# Altium footprint library Library.PcbLib: 292 footprints (part 5 of 20)
Each footprint in its own frame and in the unit in brackets; x right, y up, seen from the top. Pads: shape width x height; smd on the part's side, far side on the other; paste and mask are expansions set on the pad; w line width, h text height; cw(c..) or ccw(c..) is an arc to the next point about the centre after c.
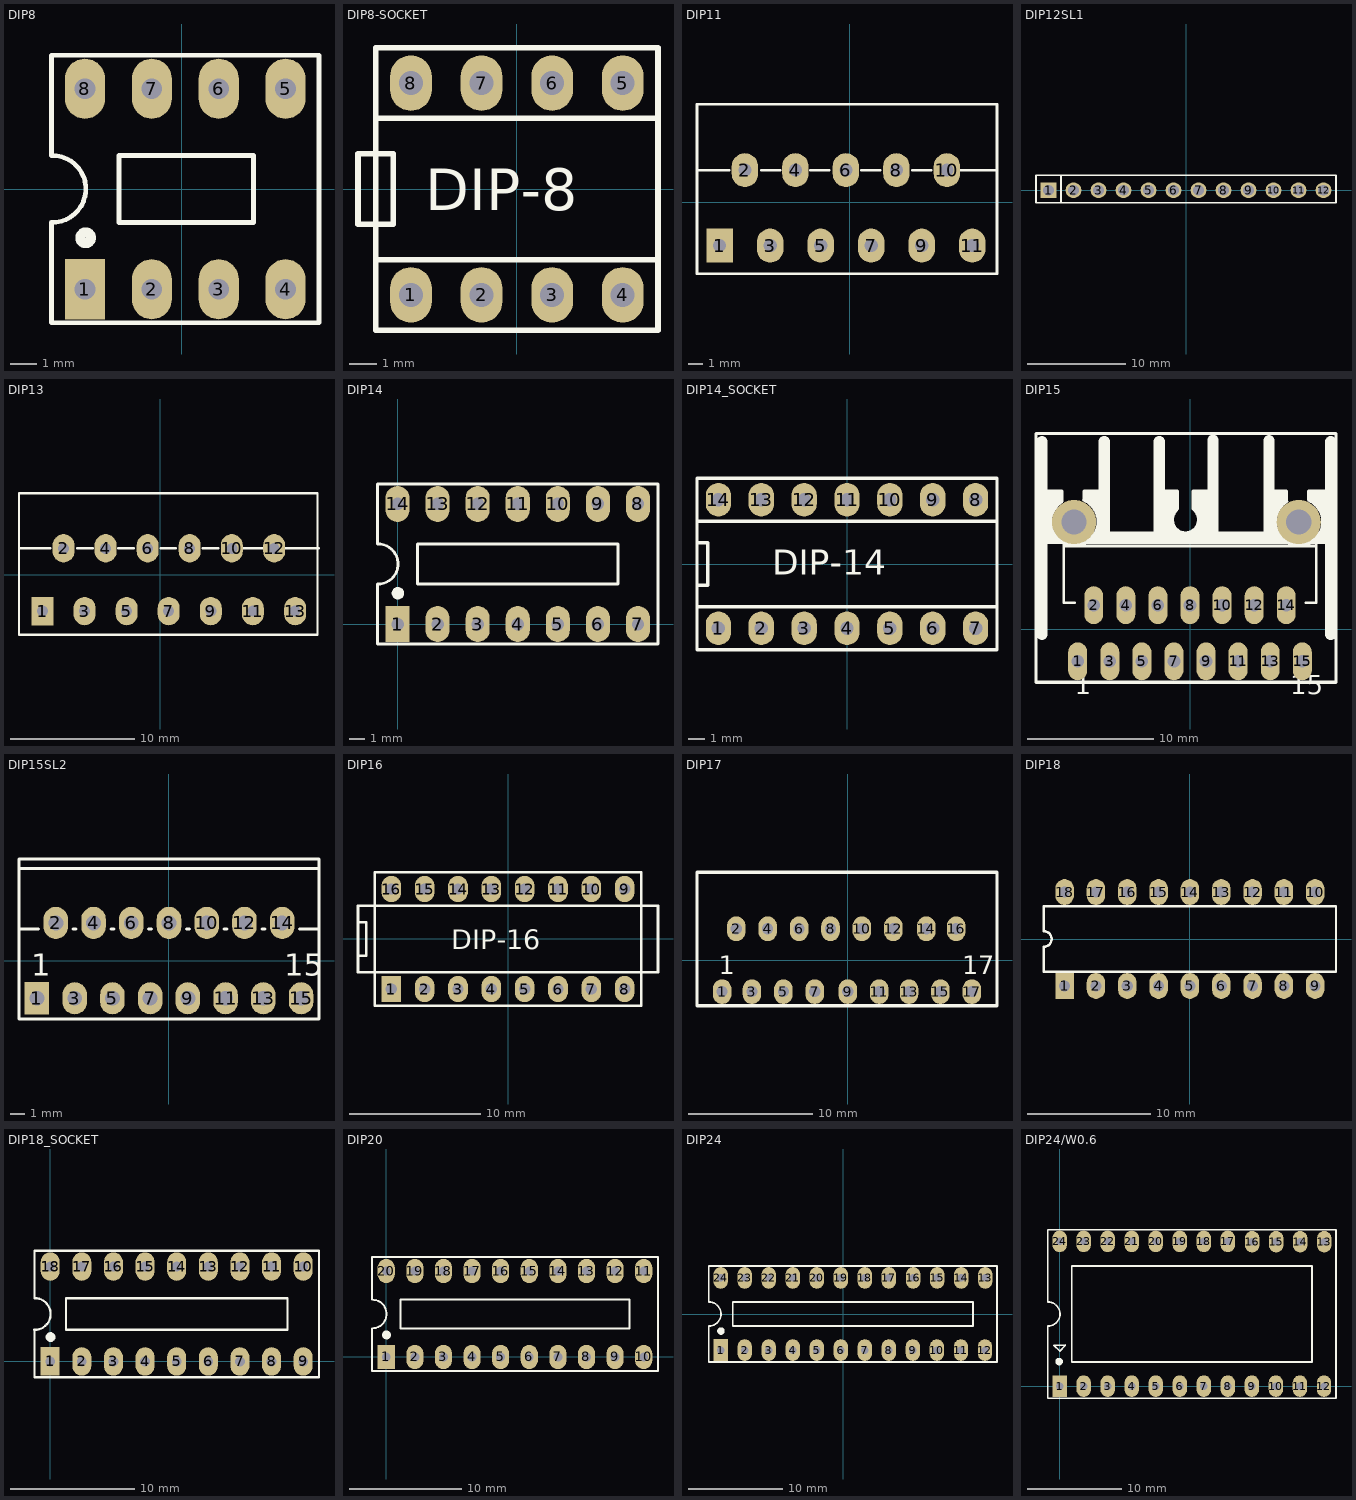
[diagram p4: the footprints below, top view; thin cyan lines are the x and y axes]

## DIP8 [mil] "DIP, 8-Leads, Row Spacing 7.62mm, Pitch 2.54mm, Body 9.91x6.73mm"
height 200
pads (8):
  rect 60x90 hole 31: 1(-145,-150)
  oval 60x90 hole 31: 2(-45,-150) 3(55,-150) 4(155,-150) 5(155,150) 6(55,150) 7(-45,150) 8(-145,150)
Top Overlay:
  circle w15: c-144,-73 r8
  lines w7: -195.38,-49.95 ccw(c-193.69,0.02) -195,50 ; -195,-50 -195,-200 205,-200 205,200 -195,200 -195,51 ; -94,-50 -94,50 107,50 107,-50 -94,-50
3D body "User Library-DIP8-300-metric.step": height 177.17, standoff -137.8, extent -212.6,-152.76 212.6,152.77

## DIP8-SOCKET [mm] "DIP, 8-Leads, Row Spacing 7.62mm, Pitch 2.54mm, Body 9.91x6.73mm"
pads (8):
  oval 1.5x2 hole 0.864: 1(-3.81,-3.81) 2(-1.27,-3.81) 3(1.27,-3.81) 4(3.81,-3.81) 5(3.81,3.81) 6(1.27,3.81) 7(-1.27,3.81) 8(-3.81,3.81)
Top Overlay:
  lines w0.203: -5.08,-2.54 5.08,-2.54 ; -5.08,-2.54 -5.08,2.54 ; -5.08,-2.54 5.08,-2.54 ; -5.08,-2.54 -5.08,2.54 ; -5.08,-2.54 -5.08,-5.08 5.08,-5.08 5.08,2.54 ; -5.08,-2.54 -5.08,-1.27 -4.445,-1.27 ; -5.08,2.54 5.08,2.54 ; -5.08,2.54 5.08,2.54 ; -4.445,-1.27 -4.445,1.27 ; -4.445,-1.27 -5.715,-1.27 -5.715,1.27 -4.445,1.27 ; -4.445,-1.27 -4.445,1.27 ; -4.445,1.27 -5.08,1.27 -5.08,5.08 5.08,5.08 5.08,2.54 ; 5.08,-2.54 5.08,2.54 ; 5.08,-2.54 5.08,2.54
  text "DIP-8" at -3.302,-0.762 h1.5
3D body "User Library-DIP8-300-metric.step": height 8.5, standoff 0.5, extent -5.654,-4.007 5.146,3.753
3D body "Socket 8.step": height 4.5, standoff -3.09, extent -5.08,-5.08 5.08,5.08

## DIP11 [mil]
pads (11):
  rect 70x90 hole 35: 1(-345,-115)
  oval 70x90 hole 35: 2(-278.07,85) 3(-211.14,-115) 4(-144.21,85) 5(-77.28,-115) 6(-10.35,85) 7(56.57,-115) 8(123.5,85) 9(190.43,-115) 10(257.36,85) 11(324.29,-115)
Top Overlay:
  lines w7: -405,85 -320,85 ; -235,85 -185,85 ; -105,85 -55,85 ; 30,85 80,85 ; 165,85 215,85 ; 285,85 390,85 ; -405,-190 -405,260 390,260 390,-190 -405,-190
3D body "User Library-TDA 2004R.step": height 826.77, standoff -138.19, extent -404.09,-120 384.09,252.82

## DIP12SL1 [mm]
height 8.54
pads (12):
  rect 1.6x1.6 hole 1.1: 1(-13.97,0)
  round 1.6 hole 1.1: 2(-11.43,0) 3(-8.89,0) 4(-6.35,0) 5(-3.81,0) 6(-1.27,0) 7(1.27,0) 8(3.81,0) 9(6.35,0) 10(8.89,0) 11(11.43,0) 12(13.97,0)
Top Overlay:
  lines w0.2: -12.7,-1.27 -12.7,1.397 ; -15.24,-1.27 15.24,-1.27 15.24,1.524 -13.081,1.524 -15.24,1.524 -15.24,-1.27
3D body: height 18, standoff 8, extent -14.986,1.27 14.859,1.651
3D body: height 12, standoff 4.5, extent -15.367,-1.397 15.24,1.524
3D body "61301211121.stp": height 10.17, standoff -1.37, extent -15.24,-1.27 15.24,1.27

## DIP13 [mil]
pads (13):
  rect 70x90 hole 35: 1(-375,-115)
  oval 70x90 hole 35: 2(-308.07,85) 3(-241.14,-115) 4(-174.21,85) 5(-107.28,-115) 6(-40.35,85) 7(26.57,-115) 8(93.5,85) 9(160.43,-115) 10(227.36,85) 11(294.29,-115) 12(362.36,85) 13(429.29,-115)
Top Overlay:
  lines w7: -450,85 -350,85 ; -265,85 -215,85 ; -135,85 -85,85 ; 0,85 50,85 ; 135,85 185,85 ; 255,85 505,85 ; -450,-190 500,-190 500,-170 500,20 500,260 -450,260 -450,-190
3D body "User Library-TDA1518BQ.step": height 712.6, standoff -109.15, extent -447.44,-125 497.44,254.14

## DIP14 [mil] "DIP, 14-Leads, Row Spacing 7.62mm, Pitch 2.54mm, Body 19.2x6.6mm"
height 100
pads (14):
  rect 60x90 hole 31: 1(0,0)
  oval 60x90 hole 31: 2(100,0) 3(200,0) 4(300,0) 5(400,0) 6(500,0) 7(600,0) 8(600,300) 9(500,300) 10(400,300) 11(300,300) 12(200,300) 13(100,300) 14(0,300)
Top Overlay:
  circle w15: c1,77 r8
  lines w7: -50.38,100.05 ccw(c-48.69,150.02) -50,200 ; -50,100 -50,-50 650,-50 650,350 -50,350 -50,201 ; 50,100 50,200 550,200 550,100 50,100
3D body "SW3DPS-DIP-14-DEFAULT.STEP": height 145.48, standoff -129.32, extent -69.99,-12.47 680.01,302.49

## DIP14_SOCKET [mm]
height 5.59
pads (14):
  oval 1.5x2 hole 0.8: 1(-7.62,-3.81) 2(-5.08,-3.81) 3(-2.54,-3.81) 4(0,-3.81) 5(2.54,-3.81) 6(5.08,-3.81) 7(7.62,-3.81) 8(7.62,3.81) 9(5.08,3.81) 10(2.54,3.81) 11(0,3.81) 12(-2.54,3.81) 13(-5.08,3.81) 14(-7.62,3.81)
Top Overlay:
  lines w0.203: -8.89,-2.54 8.89,-2.54 ; -8.89,-2.54 8.89,-2.54 ; -8.89,-2.54 -8.89,-1.27 ; -8.89,-2.54 -8.89,-1.27 ; -8.89,-1.27 -8.89,1.27 ; -8.89,-1.27 -8.255,-1.27 ; -8.89,-1.27 -8.89,1.27 ; -8.89,-1.27 -8.255,-1.27 ; -8.89,1.27 -8.89,2.54 ; -8.89,1.27 -8.255,1.27 ; -8.89,1.27 -8.89,2.54 ; -8.89,1.27 -8.255,1.27 ; -8.89,2.54 8.89,2.54 ; -8.89,2.54 8.89,2.54 ; -8.255,-1.27 -8.255,1.27 ; -8.255,-1.27 -8.255,1.27 ; 8.89,-2.54 8.89,2.54 ; -8.89,-5.08 -8.89,5.08 8.89,5.08 8.89,-5.08 -8.89,-5.08
  text "DIP-14" at -4.445,-0.635 h1.5
3D body "User Library-DIP14-300-metric.step": height 8.5, standoff 0.5, extent -9.05,-3.88 9.05,3.88
3D body "Socket 14.step": height 4.5, standoff -3.09, extent -8.89,-5.08 8.89,5.08

## DIP15 [mm]
height 21
pads (17):
  oval 1.5x3 hole 1: 1(-8.89,-2.54) 2(-7.62,1.905) 3(-6.35,-2.54) 4(-5.08,1.905) 5(-3.81,-2.54) 6(-2.54,1.905) 7(-1.27,-2.54) 8(0,1.905) 9(1.27,-2.54) 10(2.54,1.905) 11(3.81,-2.54) 12(5.08,1.905) 13(6.35,-2.54) 14(7.62,1.905) 15(8.89,-2.54)
  round 3.5 hole 2: ""(-9.178,8.484) ""(8.602,8.484)
Top Overlay:
  region: 0.127,10.922 1.651,10.922 1.651,7.366 1.397,7.62 0.127,7.62 0.635,8.128 0.635,9.144 0.127,9.652
  region: -2.159,10.922 -0.889,10.922 -0.889,9.652 -1.397,9.144 -1.397,8.128 -0.889,7.62 -2.159,7.62
  region: -8.382,10.922 -8.382,10.287 -7.874,9.779 -7.747,9.779 -7.493,9.525 -7.493,9.271 -7.366,9.144 -7.366,7.62 -6.731,7.62 -6.604,7.747 -6.985,8.128 -6.985,10.922
  region: -11.43,10.922 -10.16,10.922 -10.16,10.033 -10.287,10.033 -10.795,9.525 -10.795,9.271 -11.049,9.017 -11.049,8.128 -10.922,8.001 -10.922,7.62 -11.43,7.62
  region: 6.35,10.922 7.62,10.922 7.62,10.033 7.493,10.033 6.985,9.525 6.985,9.271 6.731,9.017 6.731,8.128 6.858,8.001 6.858,7.62 6.35,7.62
  region: 9.398,10.922 9.398,10.287 9.906,9.779 10.033,9.779 10.287,9.525 10.287,9.271 10.414,9.144 10.414,7.62 11.049,7.62 11.176,7.747 10.795,8.128 10.795,10.922
  lines w0.2: -10,6.59 10,6.59 ; -9.144,2.09 -10,2.09 -10,7.09 10,7.09 10,2.09 9.144,2.09
  lines w0.254: -11.43,10.922 -10.16,10.922 -10.16,10.16 ; -10.127,10.106 ccw(c-9.144,8.509) -8.405,10.233 ; -9.863,9.144 ccw(c-9.123,8.403) -8.382,9.144 ; -8.382,10.287 -8.382,10.922 -7.112,10.922 ; -2.413,10.922 -1.016,10.922 -1.016,9.525 -1.143,9.398 ; -1.093,9.391 ccw(c-0.36,8.657) 0.374,9.391 ; 0.381,9.398 0.254,9.525 0.254,10.922 1.397,10.922 ; 6.35,10.922 7.62,10.922 7.62,10.16 ; 7.653,10.106 ccw(c8.636,8.509) 9.375,10.233 ; 9.398,10.287 9.398,10.922 10.668,10.922 ; -12.192,-4.191 11.557,-4.191 11.557,15.494 -12.192,15.494 -12.192,-4.191
  lines w0.889: -11.718,-0.406 -11.718,14.834 ; -6.782,7.341 -6.782,14.859 ; -2.438,7.341 -2.438,14.859 ; 1.829,7.315 1.829,14.986 ; 6.248,7.315 6.248,14.935 ; 11.142,-0.406 11.142,14.834
  lines w1.016: -11.557,7.239 10.922,7.239
  text "1" at -9.12,-5.165 h1.5
  text "15" at 7.94,-5.165 h1.5
3D body "User Library-heat sink-1.STEP": height 30.64, standoff 0.02, extent -11.684,-1.143 11.216,15.257
3D body "User Library-MULTIWAT T15.step": height 22.74, standoff -2.18, extent -9.8,-2.815 9.8,6.253

## DIP15SL2 [mil]
height 826.77
pads (15):
  rect 65x85 hole 39.37: 1(-350,-100)
  oval 65x85 hole 39.37: 2(-300,100) 3(-250,-100) 4(-200,100) 5(-150,-100) 6(-100,100) 7(-50,-100) 8(0,100) 9(50,-100) 10(100,100) 11(150,-100) 12(200,100) 13(250,-100) 14(300,100) 15(350,-100)
Top Overlay:
  lines w7.87: -397.64,243.7 397.64,243.7 ; -346.46,84.25 -397.64,84.25 ; -253.94,84.25 -246.06,84.25 ; -153.94,84.25 -146.06,84.25 ; -53.94,84.25 -46.06,84.25 ; 46.06,84.25 53.94,84.25 ; 146.06,84.25 153.94,84.25 ; 246.06,84.25 253.94,84.25 ; 346.46,84.25 397.64,84.25 397.64,269.29 -397.64,269.29 -397.64,84.25 ; 397.64,105 397.64,-155 -397.64,-155 -397.64,84.25
  text "1" at -365,-40 h59.06
  text "15" at 305,-40 h59.06
3D body "User Library-MULTIWAT T15.step": height 895.25, standoff -85.66, extent -381.82,-109.82 389.84,247.19

## DIP16 [mm]
pads (16):
  rect 1.5x2 hole 0.864: 1(-8.897,-3.812)
  oval 1.5x2 hole 0.864: 2(-6.357,-3.812) 3(-3.817,-3.812) 4(-1.277,-3.812) 5(1.263,-3.812) 6(3.803,-3.812) 7(6.343,-3.812) 8(8.883,-3.812) 9(8.883,3.808) 10(6.343,3.808) 11(3.803,3.808) 12(1.263,3.808) 13(-1.277,3.808) 14(-3.817,3.808) 15(-6.357,3.808) 16(-8.897,3.808)
Top Overlay:
  lines w0.203: -11.437,-2.542 -11.437,-1.272 ; -11.437,-2.542 11.423,-2.542 ; -11.437,-2.542 -11.437,-1.272 ; -11.437,-2.542 11.423,-2.542 ; -11.437,-1.272 -10.802,-1.272 ; -11.437,-1.272 -11.437,1.268 ; -11.437,-1.272 -10.802,-1.272 ; -11.437,-1.272 -11.437,1.268 ; -11.437,1.268 -10.802,1.268 ; -11.437,1.268 -11.437,2.538 ; -11.437,1.268 -10.802,1.268 ; -11.437,1.268 -11.437,2.538 ; -11.437,2.538 11.423,2.538 ; -11.437,2.538 11.423,2.538 ; -10.802,-1.272 -10.802,1.268 ; -10.802,-1.272 -10.802,1.268 ; 11.423,-2.542 11.423,2.538 ; 11.423,-2.542 11.423,2.538 ; -10.167,-5.082 10.153,-5.082 10.153,5.078 -10.167,5.078 -10.167,-5.082
  text "DIP-16" at -4.325,-0.764 h1.5
3D body "User Library-DIP16-300.step": height 1.99, standoff -5.58, extent -10,-3.935 10,3.935

## DIP17 [mm]
height 21
pads (17):
  oval 1.5x2 hole 0.9: 1(-10.16,-2.54) 2(-9.017,2.54) 3(-7.747,-2.54) 4(-6.477,2.54) 5(-5.207,-2.54) 6(-3.937,2.54) 7(-2.667,-2.54) 8(-1.397,2.54) 9(0,-2.54) 10(1.143,2.54) 11(2.54,-2.54) 12(3.683,2.54) 13(4.953,-2.54) 14(6.35,2.54) 15(7.493,-2.54) 16(8.763,2.54) 17(10.033,-2.54)
Top Overlay:
  lines w0.254: -12.192,-3.683 -12.192,7.112 12.065,7.112 12.065,-3.683 -12.192,-3.683
  text "17" at 9.271,-1.143 h1.5
  text "1" at -10.414,-1.143 h1.5
3D body "User Library-TDA1562Q.STEP": height 19, standoff -5, extent -12.065,-2.731 11.935,7.049

## DIP18 [mm] "DIP; 18 Leads; Row Spacing 7.62 mm; Pitch 2.54 mm"
height 5.33
pads (18):
  rect 1.5x2.1 hole 0.9: 1(-10.16,-3.81)
  oval 1.5x2.1 hole 0.9: 2(-7.62,-3.81) 3(-5.08,-3.81) 4(-2.54,-3.81) 5(0,-3.81) 6(2.54,-3.81) 7(5.08,-3.81) 8(7.62,-3.81) 9(10.16,-3.81) 10(10.16,3.81) 11(7.62,3.81) 12(5.08,3.81) 13(2.54,3.81) 14(0,3.81) 15(-2.54,3.81) 16(-5.08,3.81) 17(-7.62,3.81) 18(-10.16,3.81)
Top Overlay:
  lines w0.2: -11.85,-2.65 11.85,-2.65 11.85,2.65 -11.85,2.65 -11.85,0.635 cw(c-11.85,0) -11.85,-0.635 -11.85,-2.65
3D body "User Library-DIP18-300.step": height 5.08, standoff -2.49, extent -11.495,-4.062 11.495,3.808

## DIP18_SOCKET [mil]
height 100
pads (18):
  rect 60x90 hole 31: 1(0,0)
  oval 60x90 hole 31: 2(100,0) 3(200,0) 4(300,0) 5(400,0) 6(500,0) 7(600,0) 8(700,0) 9(800,0) 10(800,300) 11(700,300) 12(600,300) 13(500,300) 14(400,300) 15(300,300) 16(200,300) 17(100,300) 18(0,300)
Top Overlay:
  circle w15: c1,77 r8
  lines w7: -50.38,100.05 ccw(c-48.69,150.02) -50,200 ; -50,100 -50,-50 850,-50 850,350 -50,350 -50,201 ; 50,100 50,200 750,200 750,100 50,100
3D body "User Library-DIP18-300.step": height 298.43, standoff 0.39, extent -50.12,-4.92 855,304.92
3D body "SW3dPS-DIP18.STEP": height 118.71, standoff -131.12, extent -45.36,-56.69 855,356.69

## DIP20 [mil] "DIP 20, 20 PIN, W 300mil, Pin to pin 100mil"
height 100
pads (20):
  rect 60x85 hole 31: 1(0,0)
  oval 60x85 hole 31: 2(100,0) 3(200,0) 4(300,0) 5(400,0) 6(500,0) 7(600,0) 8(700,0) 9(800,0) 10(900,0) 11(900,300) 12(800,300) 13(700,300) 14(600,300) 15(500,300) 16(400,300) 17(300,300) 18(200,300) 19(100,300) 20(0,300)
Top Overlay:
  circle w15: c1,77 r8
  lines w7: -50.38,100.05 ccw(c-48.69,150.02) -50,200 ; -50,100 -50,-50 950,-50 950,350 -50,350 -50,201 ; 50,100 50,200 850,200 850,100 50,100
3D body "User Library-DIP20-300.step": height 177.17, standoff -137.8, extent -53.93,2.23 953.94,307.77

## DIP24 [mil]
height 100
pads (24):
  rect 60x90 hole 31: 1(-510,-150)
  oval 60x90 hole 31: 2(-410,-150) 3(-310,-150) 4(-210,-150) 5(-110,-150) 6(-10,-150) 7(90,-150) 8(190,-150) 9(290,-150) 10(390,-150) 11(490,-150) 12(590,-150) 13(591,150) 14(491,150) 15(391,150) 16(291,150) 17(190,150) 18(90,150) 19(-10,150) 20(-110,150) 21(-210,150) 22(-310,150) 23(-410,150) 24(-510,150)
Top Overlay:
  circle w15: c-509,-71 r8
  lines w7: -560.38,-49.95 ccw(c-558.68,0.02) -560,50 ; -560,-50 -560,-200 640,-200 640,200 -560,200 -560,51 ; -460,-50 540,-50 540,50 -460,50 -460,-50
3D body "SW3dPS-DIP24-300.STEP": height 200, standoff -98.03, extent -599.04,-152.92 671.04,156.92

## DIP24/W0.6 [mil] "DIP24/W.600, Pin to pin 100mil"
height 100
pads (24):
  rect 60x90 hole 31: 1(0,0)
  oval 60x90 hole 31: 2(100,0) 3(200,0) 4(300,0) 5(400,0) 6(500,0) 7(600,0) 8(700,0) 9(800,0) 10(900,0) 11(1000,0) 12(1100,0) 13(1101,601) 14(1001,601) 15(901,601) 16(801,601) 17(700,602) 18(600,602) 19(500,602) 20(400,602) 21(300,602) 22(200,602) 23(100,602) 24(0,602)
Top Overlay:
  circle w15: c-2,102 r8
  lines w7: -50,350 -50,650 1150,650 1150,-50 -50,-50 -50,250 ccw(c-48.31,299.97) -49.62,349.95 ; -25,170 -24,170 0,146 0,145 24,169 24,171 23,170 -25,170 ; 50,100 1050,100 1050,500 50,500 50,100
3D body "SW3DPS-DIP 24 IC WITH 0_280IN WINDOW-DEFAULT.STEP": height 227.95, standoff -129.92, extent -82.52,0.16 1202.52,600